# Altium footprint library Vowstar_Module.PcbLib: 57 footprints (part 3 of 4)
Each footprint in its own frame and in the unit in brackets; x right, y up, seen from the top. Pads: shape width x height; smd on the part's side, far side on the other; paste and mask are expansions set on the pad; w line width, h text height; cw(c..) or ccw(c..) is an arc to the next point about the centre after c.
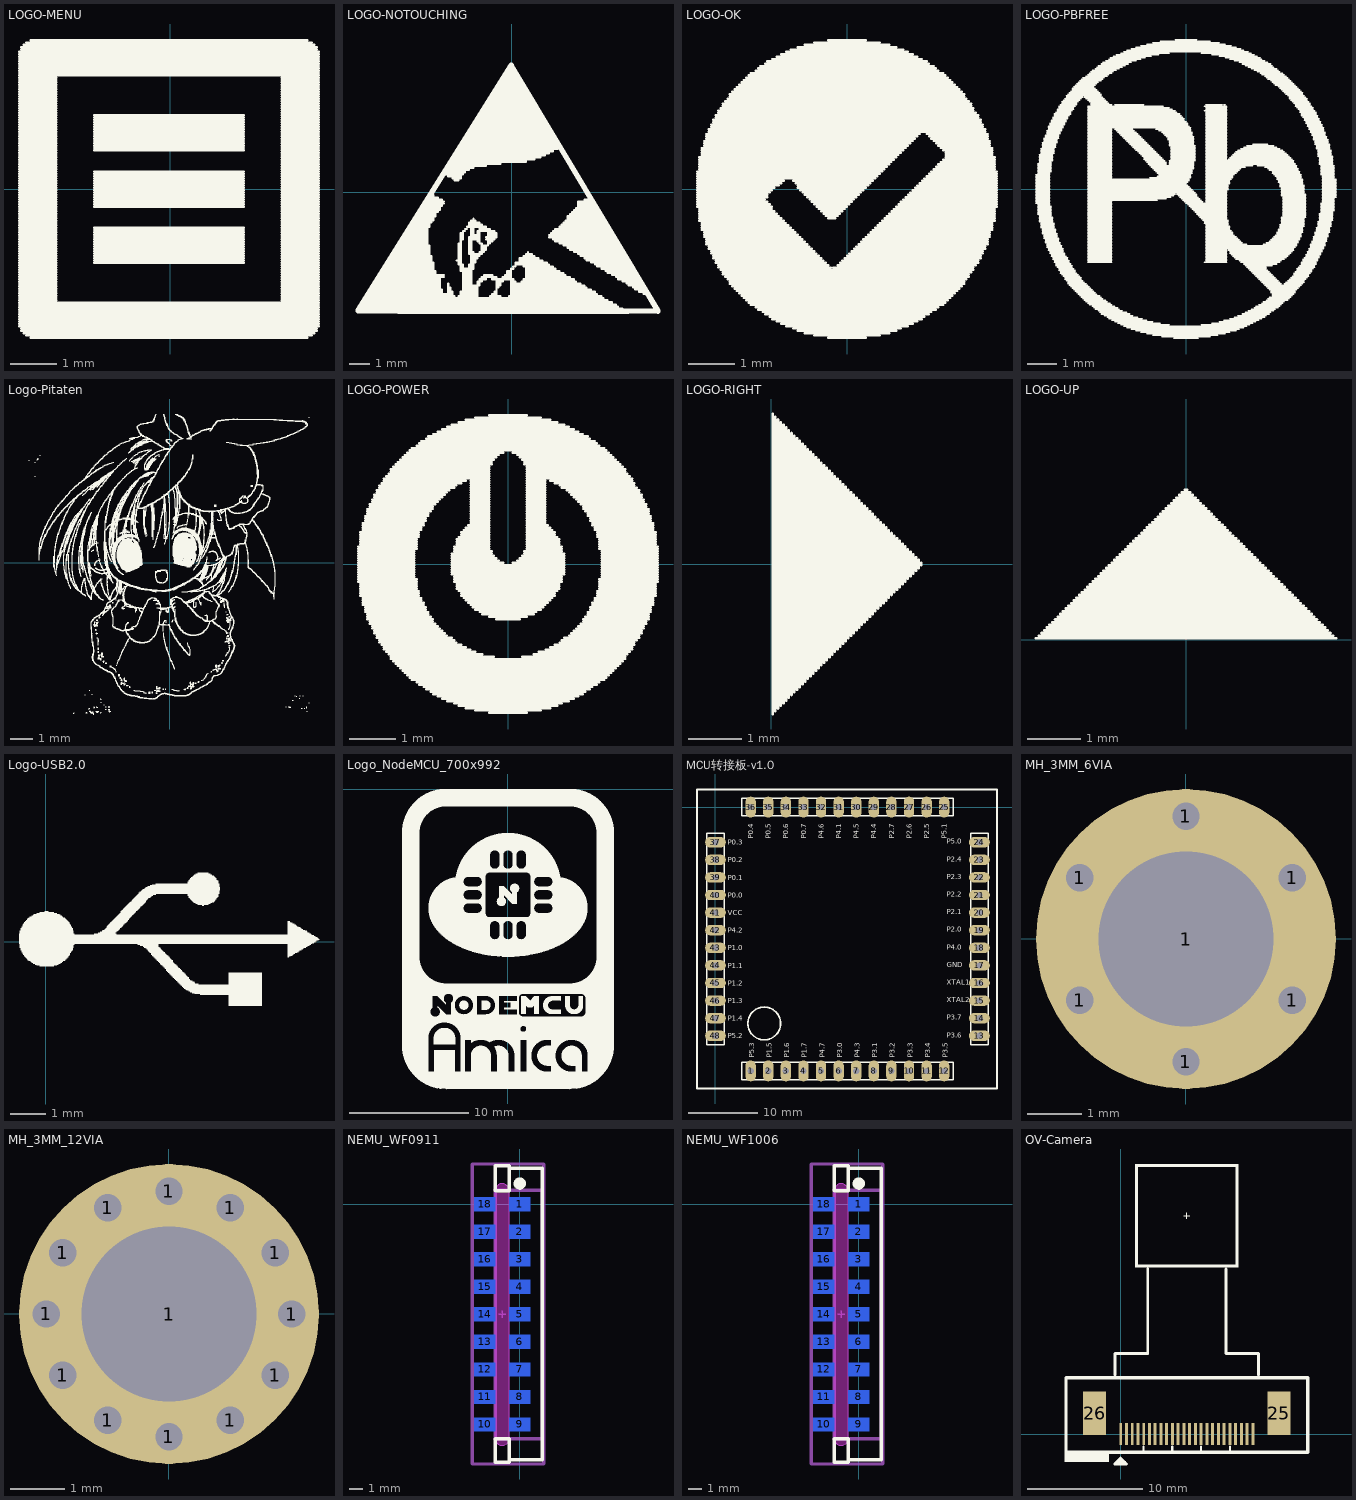
[diagram p2: the footprints below, top view; thin cyan lines are the x and y axes]

## LOGO-MENU [mm] "LOGO-MENU"
Top Overlay:
  drawing of 272 lines, arcs and shapes, not listed

## LOGO-NOTOUCHING [mm] "LOGO-NOTOUCHING"
Top Overlay:
  drawing of 549 lines, arcs and shapes, not listed

## LOGO-OK [mm] "LOGO-OK"
Top Overlay:
  drawing of 203 lines, arcs and shapes, not listed

## LOGO-PBFREE [mm] "LOGO-PBFREE"
Top Overlay:
  drawing of 745 lines, arcs and shapes, not listed

## Logo-Pitaten [mm] "Logo-Pitaten"
Top Overlay:
  drawing of 7910 lines, arcs and shapes, not listed

## LOGO-POWER [mm] "LOGO-POWER"
Top Overlay:
  drawing of 312 lines, arcs and shapes, not listed

## LOGO-RIGHT [mm] "LOGO-RIGHT"
Top Overlay:
  lines w0.051: 0.025,-2.819 0.025,2.819 ; 0.076,-2.769 0.076,2.769 ; 0.127,-2.718 0.127,2.718 ; 0.178,-2.667 0.178,2.667 ; 0.229,-2.616 0.229,2.616 ; 0.279,-2.565 0.279,2.565 ; 0.33,-2.515 0.33,2.515 ; 0.381,-2.464 0.381,2.464 ; 0.432,-2.413 0.432,2.413 ; 0.483,-2.362 0.483,2.362 ; 0.533,-2.311 0.533,2.311 ; 0.584,-2.261 0.584,2.261 ; 0.635,-2.21 0.635,2.21 ; 0.686,-2.159 0.686,2.159 ; 0.737,-2.108 0.737,2.108 ; 0.787,-2.057 0.787,2.057 ; 0.838,-2.007 0.838,2.007 ; 0.889,-1.956 0.889,1.956 ; 0.94,-1.905 0.94,1.905 ; 0.991,-1.854 0.991,1.854 ; 1.041,-1.803 1.041,1.803 ; 1.092,-1.753 1.092,1.753 ; 1.143,-1.702 1.143,1.702 ; 1.194,-1.651 1.194,1.651 ; 1.245,-1.6 1.245,1.6 ; 1.295,-1.549 1.295,1.549 ; 1.346,-1.499 1.346,1.499 ; 1.397,-1.448 1.397,1.448 ; 1.448,-1.397 1.448,1.397 ; 1.499,-1.346 1.499,1.346 ; 1.549,-1.295 1.549,1.295 ; 1.6,-1.245 1.6,1.245 ; 1.651,-1.194 1.651,1.194 ; 1.702,-1.143 1.702,1.143 ; 1.753,-1.092 1.753,1.092 ; 1.803,-1.041 1.803,1.041 ; 1.854,-0.991 1.854,0.991 ; 1.905,-0.94 1.905,0.94 ; 1.956,-0.889 1.956,0.889 ; 2.007,-0.838 2.007,0.838 ; 2.057,-0.787 2.057,0.787 ; 2.108,-0.737 2.108,0.737 ; 2.159,-0.686 2.159,0.686 ; 2.21,-0.635 2.21,0.635 ; 2.261,-0.584 2.261,0.584 ; 2.311,-0.533 2.311,0.533 ; 2.362,-0.483 2.362,0.483 ; 2.413,-0.432 2.413,0.432 ; 2.464,-0.381 2.464,0.381 ; 2.515,-0.33 2.515,0.33 ; 2.565,-0.279 2.565,0.279 ; 2.616,-0.229 2.616,0.229 ; 2.667,-0.178 2.667,0.178 ; 2.718,-0.127 2.718,0.127 ; 2.769,-0.076 2.769,0.076 ; 2.819,-0.025 2.819,0.025

## LOGO-UP [mm] "LOGO-UP"
Top Overlay:
  lines w0.051: -2.819,0.025 2.819,0.025 ; -2.769,0.076 2.769,0.076 ; -2.718,0.127 2.718,0.127 ; -2.667,0.178 2.667,0.178 ; -2.616,0.229 2.616,0.229 ; -2.565,0.279 2.565,0.279 ; -2.515,0.33 2.515,0.33 ; -2.464,0.381 2.464,0.381 ; -2.413,0.432 2.413,0.432 ; -2.362,0.483 2.362,0.483 ; -2.311,0.533 2.311,0.533 ; -2.261,0.584 2.261,0.584 ; -2.21,0.635 2.21,0.635 ; -2.159,0.686 2.159,0.686 ; -2.108,0.737 2.108,0.737 ; -2.057,0.787 2.057,0.787 ; -2.007,0.838 2.007,0.838 ; -1.956,0.889 1.956,0.889 ; -1.905,0.94 1.905,0.94 ; -1.854,0.991 1.854,0.991 ; -1.803,1.041 1.803,1.041 ; -1.753,1.092 1.753,1.092 ; -1.702,1.143 1.702,1.143 ; -1.651,1.194 1.651,1.194 ; -1.6,1.245 1.6,1.245 ; -1.549,1.295 1.549,1.295 ; -1.499,1.346 1.499,1.346 ; -1.448,1.397 1.448,1.397 ; -1.397,1.448 1.397,1.448 ; -1.346,1.499 1.346,1.499 ; -1.295,1.549 1.295,1.549 ; -1.245,1.6 1.245,1.6 ; -1.194,1.651 1.194,1.651 ; -1.143,1.702 1.143,1.702 ; -1.092,1.753 1.092,1.753 ; -1.041,1.803 1.041,1.803 ; -0.991,1.854 0.991,1.854 ; -0.94,1.905 0.94,1.905 ; -0.889,1.956 0.889,1.956 ; -0.838,2.007 0.838,2.007 ; -0.787,2.057 0.787,2.057 ; -0.737,2.108 0.737,2.108 ; -0.686,2.159 0.686,2.159 ; -0.635,2.21 0.635,2.21 ; -0.584,2.261 0.584,2.261 ; -0.533,2.311 0.533,2.311 ; -0.483,2.362 0.483,2.362 ; -0.432,2.413 0.432,2.413 ; -0.381,2.464 0.381,2.464 ; -0.33,2.515 0.33,2.515 ; -0.279,2.565 0.279,2.565 ; -0.229,2.616 0.229,2.616 ; -0.178,2.667 0.178,2.667 ; -0.127,2.718 0.127,2.718 ; -0.076,2.769 0.076,2.769 ; -0.025,2.819 0.025,2.819

## Logo-USB2.0 [mm] "Logo-USB2.0"
Top Overlay:
  drawing of 256 lines, arcs and shapes, not listed

## Logo_NodeMCU_700x992 [mm] "Logo NodeMCU"
Top Overlay:
  drawing of 9 lines, arcs and shapes, not listed

## MCU转接板-v1.0 [mm] "MCU转接板-v1.0"
height 12.7
pads (48):
  oval 1.5x3 hole 0.9: 1(5.08,-38.1) 2(7.62,-38.1) 3(10.16,-38.1) 4(12.7,-38.1) 5(15.24,-38.1) 6(17.78,-38.1) 7(20.32,-38.1) 8(22.86,-38.1) 9(25.4,-38.1) 10(27.94,-38.1) 11(30.48,-38.1) 12(33.02,-38.1) 25(33.02,0) 26(30.48,0) 27(27.94,0) 28(25.4,0) 29(22.86,0) 30(20.32,0) 31(17.78,0) 32(15.24,0) 33(12.7,0) 34(10.16,0) 35(7.62,0) 36(5.08,0)
  oval 3x1.5 hole 0.9: 13(38.1,-33.02) 14(38.1,-30.48) 15(38.1,-27.94) 16(38.1,-25.4) 17(38.1,-22.86) 18(38.1,-20.32) 19(38.1,-17.78) 20(38.1,-15.24) 21(38.1,-12.7) 22(38.1,-10.16) 23(38.1,-7.62) 24(38.1,-5.08) 37(0,-5.08) 38(0,-7.62) 39(0,-10.16) 40(0,-12.7) 41(0,-15.24) 42(0,-17.78) 43(0,-20.32) 44(0,-22.86) 45(0,-25.4) 46(0,-27.94) 47(0,-30.48) 48(0,-33.02)
Top Overlay:
  circle w0.254: c7.036,-31.242 r2.362
  lines w0.2: -1.27,-34.29 -1.27,-3.81 1.27,-3.81 1.27,-5.715 1.27,-34.29 -1.27,-34.29 ; 3.81,-39.37 3.81,-36.83 5.715,-36.83 34.29,-36.83 34.29,-39.37 3.81,-39.37 ; 3.81,-1.27 3.81,1.27 5.715,1.27 34.29,1.27 34.29,-1.27 3.81,-1.27 ; 36.83,-34.29 36.83,-3.81 39.37,-3.81 39.37,-5.715 39.37,-34.29 36.83,-34.29
  lines w0.254: -2.667,2.54 -2.667,-40.64 40.64,-40.64 40.64,2.54 -2.54,2.54
  text "P5.2" at 1.778,-33.401 h0.76
  text "P1.4" at 1.778,-30.861 h0.76
  text "P1.2" at 1.778,-25.781 h0.76
  text "P1.3" at 1.778,-28.321 h0.76
  text "P4.2" at 1.778,-18.161 h0.76
  text "VCC" at 1.778,-15.621 h0.76
  text "P1.0" at 1.778,-20.701 h0.76
  text "P1.1" at 1.778,-23.241 h0.76
  text "P0.2" at 1.778,-8.001 h0.76
  text "P0.3" at 1.778,-5.461 h0.76
  text "P0.1" at 1.778,-10.541 h0.76
  text "P0.0" at 1.778,-13.081 h0.76
  text "P2.2" at 33.401,-12.954 h0.76
  text "P2.3" at 33.401,-10.414 h0.76
  text "P5.0" at 33.401,-5.334 h0.76
  text "P2.4" at 33.401,-7.874 h0.76
  text "GND" at 33.401,-23.114 h0.76
  text "P4.0" at 33.401,-20.574 h0.76
  text "P2.1" at 33.401,-15.494 h0.76
  text "P2.0" at 33.401,-18.034 h0.76
  text "XTAL2" at 33.401,-28.194 h0.76
  text "XTAL1" at 33.401,-25.654 h0.76
  text "P3.7" at 33.401,-30.734 h0.76
  text "P3.6" at 33.401,-33.274 h0.76
  text "P1.7" at 13.208,-36.195 h0.76
  text "P1.6" at 10.668,-36.195 h0.76
  text "P5.3" at 5.588,-36.195 h0.76
  text "P1.5" at 8.128,-36.195 h0.76
  text "P3.1" at 23.368,-36.195 h0.76
  text "P4.3" at 20.828,-36.195 h0.76
  text "P4.7" at 15.748,-36.195 h0.76
  text "P3.0" at 18.288,-36.195 h0.76
  text "P3.3" at 28.448,-36.195 h0.76
  text "P3.2" at 25.908,-36.195 h0.76
  text "P3.4" at 30.988,-36.195 h0.76
  text "P3.5" at 33.528,-36.195 h0.76
  text "P0.7" at 13.081,-4.572 h0.76
  text "P0.6" at 10.541,-4.572 h0.76
  text "P0.4" at 5.461,-4.572 h0.76
  text "P0.5" at 8.001,-4.572 h0.76
  text "P4.4" at 23.241,-4.572 h0.76
  text "P4.5" at 20.701,-4.572 h0.76
  text "P4.6" at 15.621,-4.572 h0.76
  text "P4.1" at 18.161,-4.572 h0.76
  text "P2.6" at 28.321,-4.572 h0.76
  text "P2.7" at 25.781,-4.572 h0.76
  text "P2.5" at 30.861,-4.572 h0.76
  text "P5.1" at 33.401,-4.572 h0.76

## MH_3MM_6VIA [mm] "Mechanical hole 3mm , for installation and fixing"
pads (7):
  round 1 hole 0.5: 1(-1.948,-1.125) 1(-1.948,1.125) 1(0,2.25) 1(0,-2.25) 1(1.949,-1.125) 1(1.949,1.125)
  round 5.5 hole 3.2: 1(0,0)

## MH_3MM_12VIA [mm] "Mechanical hole 3mm , for installation and fixing"
pads (13):
  round 1 hole 0.5: 1(-2.25,0) 1(-1.948,-1.125) 1(-1.948,1.125) 1(-1.125,1.949) 1(-1.125,-1.949) 1(0,2.25) 1(0,-2.25) 1(1.125,1.949) 1(1.125,-1.949) 1(1.949,-1.125) 1(1.949,1.125) 1(2.25,0)
  round 5.5 hole 3.2: 1(0,0)

## NEMU_WF0911 [mm] "NEMU Wi-Fi Module by Vowstar"
height 3.2
pads (18):
  rect 1.545x1 smd far side: 1(0,0) 2(0,-2) 3(0,-4) 4(0,-6) 5(0,-8) 6(0,-10) 7(0,-12) 8(0,-14) 9(0,-16) 10(-2.546,-16) 11(-2.546,-14) 12(-2.546,-12) 13(-2.546,-10) 14(-2.546,-8) 15(-2.546,-6) 16(-2.546,-4) 17(-2.546,-2) 18(-2.546,0)
Top Overlay:
  circle w0.5: c0,1.5 r0.2
  lines w0.254: -0.773,-18.55 1.627,-18.55 1.627,2.6 -0.773,2.6 ; -0.773,0.986 -1.773,0.986 -1.773,2.8 -0.773,2.8 -0.773,1.073 ; -1.773,-18.75 -1.773,-17.023 -0.773,-17.023 -0.773,-18.75 -1.773,-18.75
Keep-Out Layer:
  board cut-out: -1.084,1.443 -0.924,1.335 -0.816,1.175 -0.779,0.986 -0.776,0.986 -0.775,0.985 -0.775,-17.022 -0.776,-17.023 -0.779,-17.023 -0.816,-17.212 -0.924,-17.372 -1.084,-17.48 -1.273,-17.517 -1.462,-17.48 -1.622,-17.372 -1.73,-17.212 -1.767,-17.023 -1.77,-17.023 -1.77,0.986 -1.767,0.986 -1.73,1.175 -1.622,1.335 -1.462,1.443 -1.273,1.48
Keep-Out Layer:
  lines w0.025: -0.773,-17.023 cw(c-1.273,-17.023) -1.773,-17.023 -1.773,0.986 cw(c-1.273,0.986) -0.773,0.986 ; -0.773,-17.023 -0.773,0.986
Mechanical 1:
  lines w0.025: -0.773,-17.023 cw(c-1.273,-17.023) -1.773,-17.023 -1.773,0.986 cw(c-1.273,0.986) -0.773,0.986 ; -0.773,-17.023 -0.773,0.986
Mechanical 13:
  lines w0.254: -1.778,-17.043 1.651,-17.043 1.651,1.016 -1.778,1.016 -1.778,-17.043
Mechanical 15:
  lines w0.1: -1.527,-8 -1.019,-8 ; -1.273,-8.254 -1.273,-7.746
  lines w0.254: -3.454,-18.872 -3.454,2.921 1.753,2.921 1.753,-18.872 -3.454,-18.872
3D body "NEMU_WF0911.STEP": height 14.75, standoff -3, extent -1.735,-18.746 1.473,2.805

## NEMU_WF1006 [mm] "NEMU Wi-Fi Module by Vowstar"
height 3.2
pads (18):
  rect 1.545x1 smd far side: 1(0,0) 2(0,-2) 3(0,-4) 4(0,-6) 5(0,-8) 6(0,-10) 7(0,-12) 8(0,-14) 9(0,-16) 10(-2.546,-16) 11(-2.546,-14) 12(-2.546,-12) 13(-2.546,-10) 14(-2.546,-8) 15(-2.546,-6) 16(-2.546,-4) 17(-2.546,-2) 18(-2.546,0)
Top Overlay:
  circle w0.5: c0,1.5 r0.2
  lines w0.254: -0.773,-18.55 1.627,-18.55 1.627,2.6 -0.773,2.6 ; -0.773,0.986 -1.773,0.986 -1.773,2.8 -0.773,2.8 -0.773,1.073 ; -1.773,-18.75 -0.773,-18.75 -0.773,-17.023 -1.773,-17.023 -1.773,-18.75
Keep-Out Layer:
  board cut-out: -1.084,1.443 -0.924,1.335 -0.816,1.175 -0.779,0.986 -0.776,0.986 -0.775,0.985 -0.775,-17.022 -0.776,-17.023 -0.779,-17.023 -0.816,-17.212 -0.924,-17.372 -1.084,-17.48 -1.273,-17.517 -1.462,-17.48 -1.622,-17.372 -1.73,-17.212 -1.767,-17.023 -1.77,-17.023 -1.77,0.986 -1.767,0.986 -1.73,1.175 -1.622,1.335 -1.462,1.443 -1.273,1.48
Keep-Out Layer:
  lines w0.025: -0.773,-17.023 cw(c-1.273,-17.023) -1.773,-17.023 -1.773,0.986 cw(c-1.273,0.986) -0.773,0.986 ; -0.773,-17.023 -0.773,0.986
Mechanical 1:
  lines w0.025: -0.773,-17.023 cw(c-1.273,-17.023) -1.773,-17.023 -1.773,0.986 cw(c-1.273,0.986) -0.773,0.986 ; -0.773,-17.023 -0.773,0.986
Mechanical 13:
  lines w0.254: -1.778,-17.043 -1.778,1.016 1.651,1.016 1.651,-17.043 -1.778,-17.043
Mechanical 15:
  lines w0.1: -1.527,-8 -1.019,-8 ; -1.273,-8.254 -1.273,-7.746
  lines w0.254: -3.454,-18.872 1.753,-18.872 1.753,2.921 -3.454,2.921 -3.454,-18.872
3D body "NEMU_WF1006.step": height 14.75, standoff -3, extent -1.735,-18.745 1.473,2.805

## OV-Camera [mm] "OV9650/OV2460/OV3640/OV5640"
height 5.3
pads (26):
  rect 0.254x1.9 smd: 1(0,0) 2(0.5,0) 3(1,0) 4(1.5,0) 5(2,0) 6(2.5,0) 7(3,0) 8(3.5,0) 9(4,0) 10(4.5,0) 11(5,0) 12(5.5,0) 13(6,0) 14(6.5,0) 15(7,0) 16(7.5,0) 17(8,0) 18(8.5,0) 19(9,0) 20(9.5,0) 21(10,0) 22(10.5,0) 23(11,0) 24(11.5,0)
  rect 2x3.81 smd: 25(13.77,1.8) 26(-2.27,1.8)
Top Overlay:
  rectangle: 1.25,14.5 10.25,14.754
  rectangle: 1.25,23.246 10.25,23.5
  rectangle: -4.916,-2.42 -1.032,-1.57
  region: 9.996,23.5 9.996,14.5 10.25,14.5 10.25,23.5
  region: 1.25,23.5 1.25,14.5 1.504,14.5 1.504,23.5
  lines w0.02: 5.496,19 6.004,19 ; 5.75,18.746 5.75,19.254
  lines w0.2: 1.984,-1.469 1.984,-1.112 ; 4.473,-1.469 4.473,-1.112 ; 6.988,-1.469 6.988,-1.112 ; 9.503,-1.469 9.503,-1.112
  lines w0.254: -0.503,5.156 -0.503,6.985 ; -0.5,7 2.337,7 ; -0.317,-2.404 0.286,-2.404 0.345,-2.463 ; -0.016,-2.611 -0.016,-2.103 ; 2.35,7.01 2.35,14.351 ; 9.15,14.351 9.15,7.004 9.154,7 12,7 ; 11.994,5.156 11.994,6.985 ; -0.016,-2.103 0.492,-2.611 -0.524,-2.611 -0.016,-2.103
  lines w0.3: 16.266,-1.596 -4.766,-1.596 -4.766,4.882 16.277,4.882 16.277,-1.596
3D body "User Library-OV9655.STEP": height 5.75, standoff -0.28, extent -0.535,1.905 11.965,23.405
3D body "User Library-FPC0.5-SMT-24P-T.step": height 1.24, standoff -0.03, extent -3.151,0.473 14.549,4.73